# Altium footprint library COMATEL THD.PcbLib: 70 footprints (part 3 of 5)
Each footprint in its own frame and in the unit in brackets; x right, y up, seen from the top. Pads: shape width x height; smd on the part's side, far side on the other; paste and mask are expansions set on the pad; w line width, h text height; cw(c..) or ccw(c..) is an arc to the next point about the centre after c.
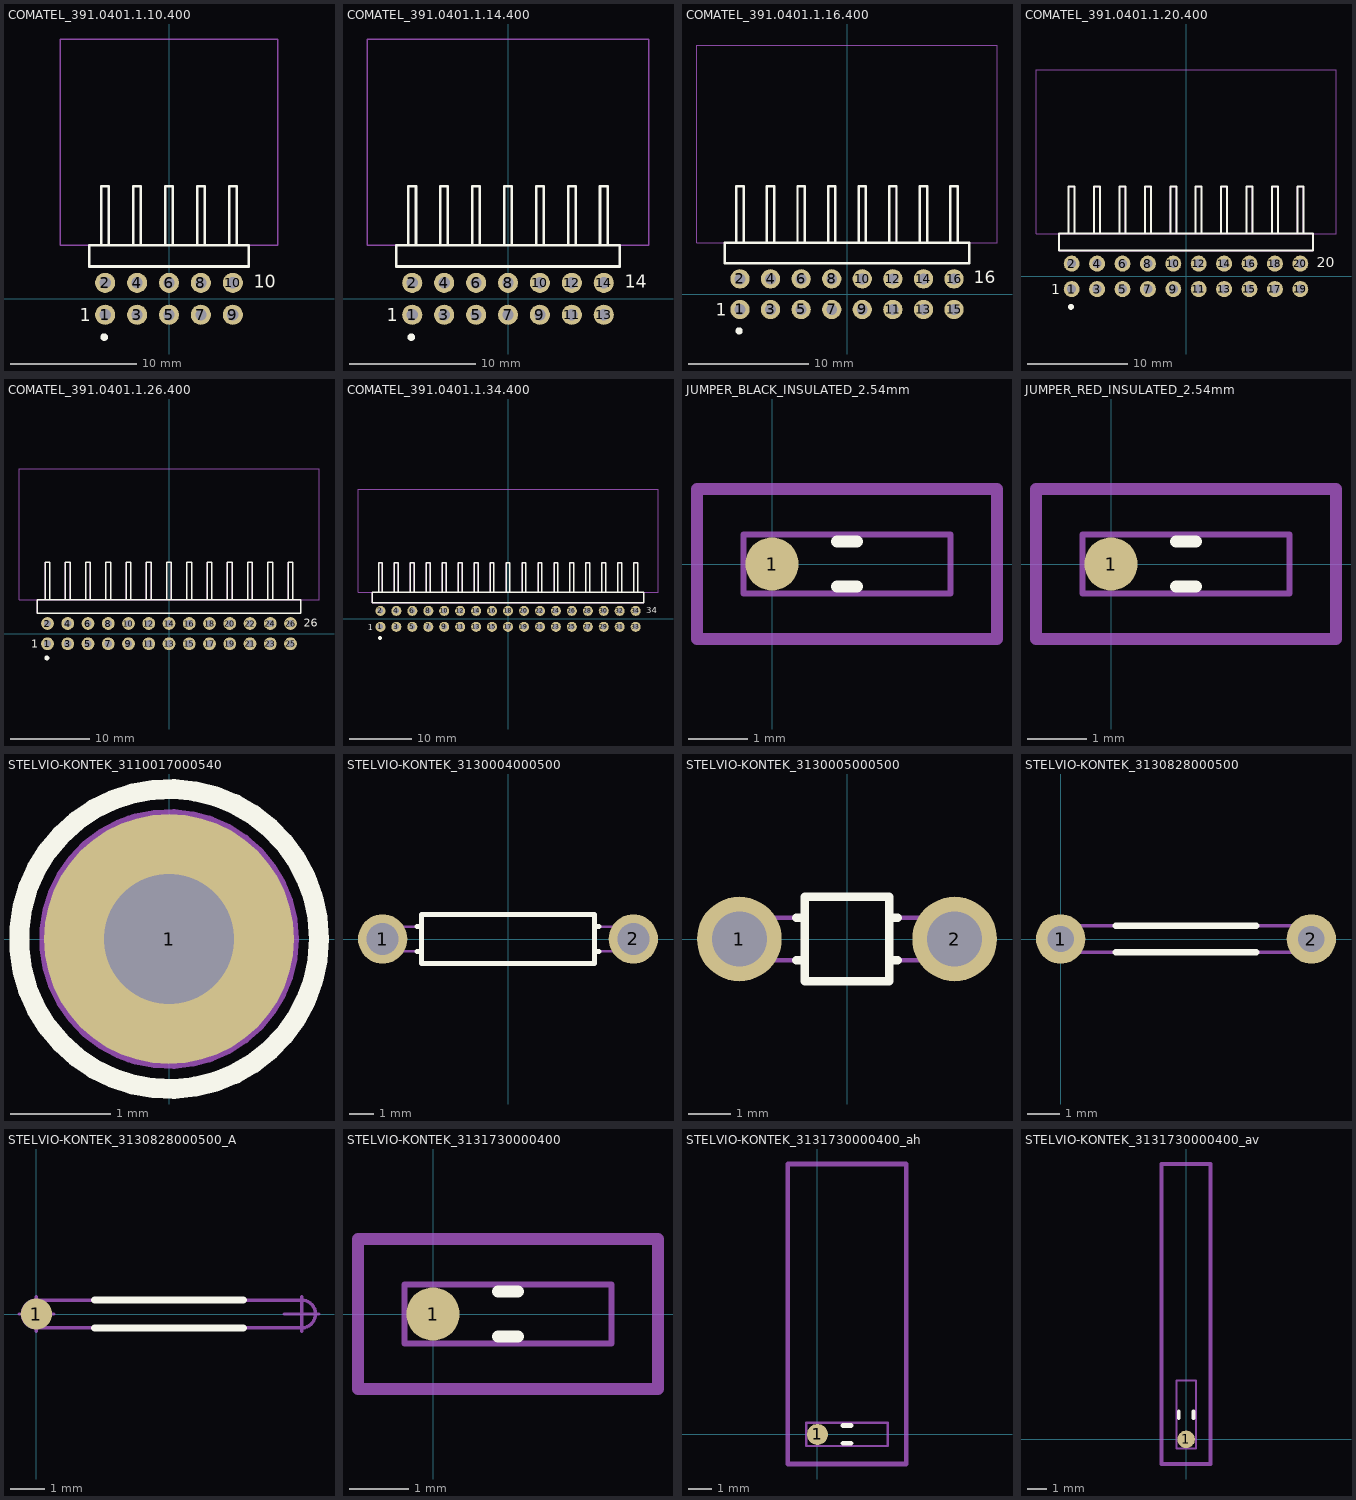
[diagram p2: the footprints below, top view; thin cyan lines are the x and y axes]

## COMATEL_391.0401.1.10.400 [mm] "10 Contacts - Pitch 2.54mm - Dual Row Right Angle Strip Header - Insulator 1.7mm"
height 8
pads (10):
  round 1.6 hole 0.9: 1(-5.08,-1.27) 2(-5.08,1.27) 3(-2.54,-1.27) 4(-2.54,1.27) 5(0,-1.27) 6(0,1.27) 7(2.54,-1.27) 8(2.54,1.27) 9(5.08,-1.27) 10(5.08,1.27)
Top Overlay:
  circle w0.3: c-5.153,-3.048 r0.15
  lines w0.2: -6.35,2.57 6.35,2.57 6.35,4.27 -6.35,4.27 -6.35,2.57 ; -5.38,4.27 -5.38,8.97 -4.78,8.97 -4.78,4.27 -5.38,4.27 ; -2.84,4.27 -2.24,4.27 -2.24,8.97 -2.84,8.97 -2.84,4.27 ; -0.3,4.27 0.3,4.27 0.3,8.97 -0.3,8.97 -0.3,4.27 ; 2.24,4.27 2.84,4.27 2.84,8.97 2.24,8.97 2.24,4.27 ; 4.78,4.27 5.38,4.27 5.38,8.97 4.78,8.97 4.78,4.27
  text "1" at -7.112,-1.778 h1.02
  text "10" at 6.731,0.889 h1.02
Mechanical 8:
  lines w0.1: -8.65,4.27 -8.65,20.67 8.65,20.67 8.65,4.27 -8.65,4.27
Mechanical 14:
  lines w0.1: -6.35,2.57 -6.35,4.27 6.35,4.27 6.35,2.57 -6.35,2.57 ; -5.38,4.27 -5.38,8.97 -4.78,8.97 -4.78,4.27 -5.38,4.27 ; -2.84,4.27 -2.24,4.27 -2.24,8.97 -2.84,8.97 -2.84,4.27 ; -0.3,4.27 0.3,4.27 0.3,8.97 -0.3,8.97 -0.3,4.27 ; 2.24,4.27 2.84,4.27 2.84,8.97 2.24,8.97 2.24,4.27 ; 4.78,4.27 5.38,4.27 5.38,8.97 4.78,8.97 4.78,4.27
  text "1" at -7.112,-1.778 h1.02
  text "10" at 6.731,0.889 h1.02
3D body "COMATEL_391.0401.1.10.400.stp": height 5.57, standoff -4.3, extent -6.35,-1.57 6.35,10.27

## COMATEL_391.0401.1.14.400 [mm] "14 Contacts - Pitch 2.54mm - Dual Row Right Angle Strip Header - Insulator 1.7mm"
height 8
pads (14):
  round 1.6 hole 0.9: 1(-7.62,-1.27) 2(-7.62,1.27) 3(-5.08,-1.27) 4(-5.08,1.27) 5(-2.54,-1.27) 6(-2.54,1.27) 7(0,-1.27) 8(0,1.27) 9(2.54,-1.27) 10(2.54,1.27) 11(5.08,-1.27) 12(5.08,1.27) 13(7.62,-1.27) 14(7.62,1.27)
Top Overlay:
  circle w0.3: c-7.693,-3.048 r0.15
  lines w0.2: -7.92,4.27 -7.32,4.27 ; -7.92,4.27 -7.92,8.97 -7.32,8.97 -7.32,4.27 ; -7.92,4.27 -7.32,4.27 ; -5.38,4.27 -4.78,4.27 ; -5.38,4.27 -5.38,8.97 -4.78,8.97 -4.78,4.27 ; -5.38,4.27 -4.78,4.27 ; -2.84,4.27 -2.24,4.27 ; -2.84,4.27 -2.84,8.97 -2.24,8.97 -2.24,4.27 ; -2.84,4.27 -2.24,4.27 ; -0.3,4.27 0.3,4.27 ; -0.3,4.27 -0.3,8.97 0.3,8.97 0.3,4.27 ; -0.3,4.27 0.3,4.27 ; 2.24,4.27 2.84,4.27 ; 2.24,4.27 2.24,8.97 2.84,8.97 2.84,4.27 ; 2.24,4.27 2.84,4.27 ; -8.89,2.57 8.89,2.57 8.89,4.27 -8.89,4.27 -8.89,2.57 ; 4.78,4.27 4.78,8.97 5.38,8.97 5.38,4.27 4.78,4.27 ; 7.32,4.27 7.32,8.97 7.92,8.97 7.92,4.27 7.32,4.27
  text "1" at -9.652,-1.778 h1.02
  text "14" at 9.271,0.889 h1.02
Mechanical 8:
  lines w0.1: -11.19,4.27 -11.19,20.67 11.19,20.67 11.19,4.27 -11.19,4.27
Mechanical 14:
  lines w0.1: -7.92,4.27 -7.32,4.27 ; -7.92,4.27 -7.92,8.97 -7.32,8.97 -7.32,4.27 ; -7.92,4.27 -7.32,4.27 ; -5.38,4.27 -4.78,4.27 ; -5.38,4.27 -5.38,8.97 -4.78,8.97 -4.78,4.27 ; -5.38,4.27 -4.78,4.27 ; -2.84,4.27 -2.24,4.27 ; -2.84,4.27 -2.84,8.97 -2.24,8.97 -2.24,4.27 ; -2.84,4.27 -2.24,4.27 ; -0.3,4.27 0.3,4.27 ; -0.3,4.27 -0.3,8.97 0.3,8.97 0.3,4.27 ; -0.3,4.27 0.3,4.27 ; 2.24,4.27 2.84,4.27 ; 2.24,4.27 2.24,8.97 2.84,8.97 2.84,4.27 ; 2.24,4.27 2.84,4.27 ; -8.89,2.57 -8.89,4.27 8.89,4.27 8.89,2.57 -8.89,2.57 ; 4.78,4.27 4.78,8.97 5.38,8.97 5.38,4.27 4.78,4.27 ; 7.32,4.27 7.32,8.97 7.92,8.97 7.92,4.27 7.32,4.27
  text "1" at -9.652,-1.778 h1.02
  text "14" at 9.271,0.889 h1.02
3D body "COMATEL_391.0401.1.14.400.stp": height 5.57, standoff -4.3, extent -8.89,-1.57 8.89,10.27

## COMATEL_391.0401.1.16.400 [mm] "16 Contacts - Pitch 2.54mm - Dual Row Right Angle Strip Header - Insulator 1.7mm"
height 8
pads (16):
  round 1.6 hole 0.9: 1(-8.89,-1.27) 2(-8.89,1.27) 3(-6.35,-1.27) 4(-6.35,1.27) 5(-3.81,-1.27) 6(-3.81,1.27) 7(-1.27,-1.27) 8(-1.27,1.27) 9(1.27,-1.27) 10(1.27,1.27) 11(3.81,-1.27) 12(3.81,1.27) 13(6.35,-1.27) 14(6.35,1.27) 15(8.89,-1.27) 16(8.89,1.27)
Top Overlay:
  circle w0.3: c-8.963,-3.048 r0.15
  lines w0.2: -9.19,4.27 -8.59,4.27 ; -9.19,4.27 -9.19,8.97 -8.59,8.97 -8.59,4.27 ; -9.19,4.27 -8.59,4.27 ; -6.65,4.27 -6.05,4.27 ; -6.65,4.27 -6.65,8.97 -6.05,8.97 -6.05,4.27 ; -6.65,4.27 -6.05,4.27 ; -4.11,4.27 -3.51,4.27 ; -4.11,4.27 -4.11,8.97 -3.51,8.97 -3.51,4.27 ; -4.11,4.27 -3.51,4.27 ; -1.57,4.27 -0.97,4.27 ; -1.57,4.27 -1.57,8.97 -0.97,8.97 -0.97,4.27 ; -1.57,4.27 -0.97,4.27 ; 0.97,4.27 1.57,4.27 ; 0.97,4.27 0.97,8.97 1.57,8.97 1.57,4.27 ; 0.97,4.27 1.57,4.27 ; -10.16,2.57 -10.16,4.27 10.16,4.27 10.16,2.57 -10.16,2.57 ; 3.51,4.27 4.11,4.27 4.11,8.97 3.51,8.97 3.51,4.27 ; 6.05,4.27 6.65,4.27 6.65,8.97 6.05,8.97 6.05,4.27 ; 8.59,4.27 8.59,8.97 9.19,8.97 9.19,4.27 8.59,4.27
  text "16" at 10.541,0.889 h1.02
  text "1" at -10.922,-1.778 h1.02
Mechanical 8:
  lines w0.1: -12.46,4.27 -12.46,20.67 12.46,20.67 12.46,4.27 -12.46,4.27
Mechanical 14:
  lines w0.1: -9.19,4.27 -8.59,4.27 ; -9.19,4.27 -9.19,8.97 -8.59,8.97 -8.59,4.27 ; -9.19,4.27 -8.59,4.27 ; -6.65,4.27 -6.05,4.27 ; -6.65,4.27 -6.65,8.97 -6.05,8.97 -6.05,4.27 ; -6.65,4.27 -6.05,4.27 ; -4.11,4.27 -3.51,4.27 ; -4.11,4.27 -4.11,8.97 -3.51,8.97 -3.51,4.27 ; -4.11,4.27 -3.51,4.27 ; -1.57,4.27 -0.97,4.27 ; -1.57,4.27 -1.57,8.97 -0.97,8.97 -0.97,4.27 ; -1.57,4.27 -0.97,4.27 ; 0.97,4.27 1.57,4.27 ; 0.97,4.27 0.97,8.97 1.57,8.97 1.57,4.27 ; 0.97,4.27 1.57,4.27 ; -10.16,2.57 10.16,2.57 10.16,4.27 -10.16,4.27 -10.16,2.57 ; 3.51,4.27 4.11,4.27 4.11,8.97 3.51,8.97 3.51,4.27 ; 6.05,4.27 6.65,4.27 6.65,8.97 6.05,8.97 6.05,4.27 ; 8.59,4.27 8.59,8.97 9.19,8.97 9.19,4.27 8.59,4.27
  text "16" at 10.541,0.889 h1.02
  text "1" at -10.922,-1.778 h1.02
3D body "COMATEL_391.0401.1.16.400.stp": height 5.57, standoff -4.3, extent -10.16,-1.57 10.16,10.27

## COMATEL_391.0401.1.20.400 [mm] "20 Contacts - Pitch 2.54mm - Dual Row Right Angle Strip Header - Insulator 1.7mm"
height 8
pads (20):
  round 1.6 hole 0.9: 1(-11.43,-1.27) 2(-11.43,1.27) 3(-8.89,-1.27) 4(-8.89,1.27) 5(-6.35,-1.27) 6(-6.35,1.27) 7(-3.81,-1.27) 8(-3.81,1.27) 9(-1.27,-1.27) 10(-1.27,1.27) 11(1.27,-1.27) 12(1.27,1.27) 13(3.81,-1.27) 14(3.81,1.27) 15(6.35,-1.27) 16(6.35,1.27) 17(8.89,-1.27) 18(8.89,1.27) 19(11.43,-1.27) 20(11.43,1.27)
Top Overlay:
  circle w0.3: c-11.503,-3.048 r0.15
  lines w0.2: -11.73,4.27 -11.13,4.27 ; -11.73,4.27 -11.73,8.97 -11.13,8.97 -11.13,4.27 ; -11.73,4.27 -11.13,4.27 ; -9.19,4.27 -8.59,4.27 ; -9.19,4.27 -9.19,8.97 -8.59,8.97 -8.59,4.27 ; -9.19,4.27 -8.59,4.27 ; -6.65,4.27 -6.05,4.27 ; -6.65,4.27 -6.65,8.97 -6.05,8.97 -6.05,4.27 ; -6.65,4.27 -6.05,4.27 ; -4.11,4.27 -3.51,4.27 ; -4.11,4.27 -4.11,8.97 -3.51,8.97 -3.51,4.27 ; -4.11,4.27 -3.51,4.27 ; -1.57,4.27 -0.97,4.27 ; -1.57,4.27 -1.57,8.97 -0.97,8.97 -0.97,4.27 ; -1.57,4.27 -0.97,4.27 ; 0.97,4.27 1.57,4.27 ; 0.97,4.27 0.97,8.97 1.57,8.97 1.57,4.27 ; 0.97,4.27 1.57,4.27 ; 3.51,4.27 4.11,4.27 ; 3.51,4.27 3.51,8.97 4.11,8.97 4.11,4.27 ; 3.51,4.27 4.11,4.27 ; 6.05,4.27 6.65,4.27 ; 6.05,4.27 6.05,8.97 6.65,8.97 6.65,4.27 ; 6.05,4.27 6.65,4.27 ; 8.59,4.27 9.19,4.27 ; 8.59,4.27 8.59,8.97 9.19,8.97 9.19,4.27 ; 8.59,4.27 9.19,4.27 ; 11.13,4.27 11.73,4.27 ; 11.13,4.27 11.13,8.97 11.73,8.97 11.73,4.27 ; 11.13,4.27 11.73,4.27 ; -12.7,2.57 -12.7,4.27 12.7,4.27 12.7,2.57 -12.7,2.57
  text "1" at -13.462,-1.778 h1.02
  text "20" at 13.081,0.889 h1.02
Mechanical 8:
  lines w0.1: -15,4.27 -15,20.67 15,20.67 15,4.27 -15,4.27
Mechanical 14:
  lines w0.1: -11.73,4.27 -11.13,4.27 ; -11.73,4.27 -11.73,8.97 -11.13,8.97 -11.13,4.27 ; -11.73,4.27 -11.13,4.27 ; -9.19,4.27 -8.59,4.27 ; -9.19,4.27 -9.19,8.97 -8.59,8.97 -8.59,4.27 ; -9.19,4.27 -8.59,4.27 ; -6.65,4.27 -6.05,4.27 ; -6.65,4.27 -6.65,8.97 -6.05,8.97 -6.05,4.27 ; -6.65,4.27 -6.05,4.27 ; -4.11,4.27 -3.51,4.27 ; -4.11,4.27 -4.11,8.97 -3.51,8.97 -3.51,4.27 ; -4.11,4.27 -3.51,4.27 ; -1.57,4.27 -0.97,4.27 ; -1.57,4.27 -1.57,8.97 -0.97,8.97 -0.97,4.27 ; -1.57,4.27 -0.97,4.27 ; 0.97,4.27 1.57,4.27 ; 0.97,4.27 0.97,8.97 1.57,8.97 1.57,4.27 ; 0.97,4.27 1.57,4.27 ; 3.51,4.27 4.11,4.27 ; 3.51,4.27 3.51,8.97 4.11,8.97 4.11,4.27 ; 3.51,4.27 4.11,4.27 ; 6.05,4.27 6.65,4.27 ; 6.05,4.27 6.05,8.97 6.65,8.97 6.65,4.27 ; 6.05,4.27 6.65,4.27 ; 8.59,4.27 9.19,4.27 ; 8.59,4.27 8.59,8.97 9.19,8.97 9.19,4.27 ; 8.59,4.27 9.19,4.27 ; 11.13,4.27 11.73,4.27 ; 11.13,4.27 11.13,8.97 11.73,8.97 11.73,4.27 ; 11.13,4.27 11.73,4.27 ; -12.7,2.57 12.7,2.57 12.7,4.27 -12.7,4.27 -12.7,2.57
  text "1" at -13.462,-1.778 h1.02
  text "20" at 13.081,0.889 h1.02
3D body "COMATEL_391.0401.1.20.400.stp": height 5.57, standoff -4.3, extent -12.7,-1.57 12.7,10.27

## COMATEL_391.0401.1.26.400 [mm] "26 Contacts - Pitch 2.54mm - Dual Row Right Angle Strip Header - Insulator 1.7mm"
height 8
pads (26):
  round 1.6 hole 0.9: 1(-15.24,-1.27) 2(-15.24,1.27) 3(-12.7,-1.27) 4(-12.7,1.27) 5(-10.16,-1.27) 6(-10.16,1.27) 7(-7.62,-1.27) 8(-7.62,1.27) 9(-5.08,-1.27) 10(-5.08,1.27) 11(-2.54,-1.27) 12(-2.54,1.27) 13(0,-1.27) 14(0,1.27) 15(2.54,-1.27) 16(2.54,1.27) 17(5.08,-1.27) 18(5.08,1.27) 19(7.62,-1.27) 20(7.62,1.27) 21(10.16,-1.27) 22(10.16,1.27) 23(12.7,-1.27) 24(12.7,1.27) 25(15.24,-1.27) 26(15.24,1.27)
Top Overlay:
  circle w0.3: c-15.313,-3.048 r0.15
  lines w0.2: -15.54,4.27 -14.94,4.27 ; -15.54,4.27 -15.54,8.97 -14.94,8.97 -14.94,4.27 ; -15.54,4.27 -14.94,4.27 ; -13,4.27 -12.4,4.27 ; -13,4.27 -13,8.97 -12.4,8.97 -12.4,4.27 ; -13,4.27 -12.4,4.27 ; -10.46,4.27 -9.86,4.27 ; -10.46,4.27 -10.46,8.97 -9.86,8.97 -9.86,4.27 ; -10.46,4.27 -9.86,4.27 ; -7.92,4.27 -7.32,4.27 ; -7.92,4.27 -7.92,8.97 -7.32,8.97 -7.32,4.27 ; -7.92,4.27 -7.32,4.27 ; -5.38,4.27 -4.78,4.27 ; -5.38,4.27 -5.38,8.97 -4.78,8.97 -4.78,4.27 ; -5.38,4.27 -4.78,4.27 ; -2.84,4.27 -2.24,4.27 ; -2.84,4.27 -2.84,8.97 -2.24,8.97 -2.24,4.27 ; -2.84,4.27 -2.24,4.27 ; -0.3,4.27 0.3,4.27 ; -0.3,4.27 -0.3,8.97 0.3,8.97 0.3,4.27 ; -0.3,4.27 0.3,4.27 ; 2.24,4.27 2.84,4.27 ; 2.24,4.27 2.24,8.97 2.84,8.97 2.84,4.27 ; 2.24,4.27 2.84,4.27 ; 4.78,4.27 5.38,4.27 ; 4.78,4.27 4.78,8.97 5.38,8.97 5.38,4.27 ; 4.78,4.27 5.38,4.27 ; 7.32,4.27 7.92,4.27 ; 7.32,4.27 7.32,8.97 7.92,8.97 7.92,4.27 ; 7.32,4.27 7.92,4.27 ; 9.86,4.27 10.46,4.27 ; 9.86,4.27 9.86,8.97 10.46,8.97 10.46,4.27 ; 9.86,4.27 10.46,4.27 ; 12.4,4.27 13,4.27 ; 12.4,4.27 12.4,8.97 13,8.97 13,4.27 ; 12.4,4.27 13,4.27 ; 14.94,4.27 15.54,4.27 ; 14.94,4.27 14.94,8.97 15.54,8.97 15.54,4.27 ; 14.94,4.27 15.54,4.27 ; -16.51,2.57 -16.51,4.27 16.51,4.27 16.51,2.57 -16.51,2.57
  text "1" at -17.272,-1.778 h1.02
  text "26" at 16.891,0.889 h1.02
Mechanical 8:
  lines w0.1: -18.81,4.27 -18.81,20.67 18.81,20.67 18.81,4.27 -18.81,4.27
Mechanical 14:
  lines w0.1: -15.54,4.27 -14.94,4.27 ; -15.54,4.27 -15.54,8.97 -14.94,8.97 -14.94,4.27 ; -15.54,4.27 -14.94,4.27 ; -13,4.27 -12.4,4.27 ; -13,4.27 -13,8.97 -12.4,8.97 -12.4,4.27 ; -13,4.27 -12.4,4.27 ; -10.46,4.27 -9.86,4.27 ; -10.46,4.27 -10.46,8.97 -9.86,8.97 -9.86,4.27 ; -10.46,4.27 -9.86,4.27 ; -7.92,4.27 -7.32,4.27 ; -7.92,4.27 -7.92,8.97 -7.32,8.97 -7.32,4.27 ; -7.92,4.27 -7.32,4.27 ; -5.38,4.27 -4.78,4.27 ; -5.38,4.27 -5.38,8.97 -4.78,8.97 -4.78,4.27 ; -5.38,4.27 -4.78,4.27 ; -2.84,4.27 -2.24,4.27 ; -2.84,4.27 -2.84,8.97 -2.24,8.97 -2.24,4.27 ; -2.84,4.27 -2.24,4.27 ; -0.3,4.27 0.3,4.27 ; -0.3,4.27 -0.3,8.97 0.3,8.97 0.3,4.27 ; -0.3,4.27 0.3,4.27 ; 2.24,4.27 2.84,4.27 ; 2.24,4.27 2.24,8.97 2.84,8.97 2.84,4.27 ; 2.24,4.27 2.84,4.27 ; 4.78,4.27 5.38,4.27 ; 4.78,4.27 4.78,8.97 5.38,8.97 5.38,4.27 ; 4.78,4.27 5.38,4.27 ; 7.32,4.27 7.92,4.27 ; 7.32,4.27 7.32,8.97 7.92,8.97 7.92,4.27 ; 7.32,4.27 7.92,4.27 ; 9.86,4.27 10.46,4.27 ; 9.86,4.27 9.86,8.97 10.46,8.97 10.46,4.27 ; 9.86,4.27 10.46,4.27 ; 12.4,4.27 13,4.27 ; 12.4,4.27 12.4,8.97 13,8.97 13,4.27 ; 12.4,4.27 13,4.27 ; 14.94,4.27 15.54,4.27 ; 14.94,4.27 14.94,8.97 15.54,8.97 15.54,4.27 ; 14.94,4.27 15.54,4.27 ; -16.51,2.57 16.51,2.57 16.51,4.27 -16.51,4.27 -16.51,2.57
  text "1" at -17.272,-1.778 h1.02
  text "26" at 16.891,0.889 h1.02
3D body "COMATEL_391.0401.1.26.400.stp": height 5.57, standoff -4.3, extent -16.51,-1.57 16.51,10.27

## COMATEL_391.0401.1.34.400 [mm] "34 Contacts - Pitch 2.54mm - Dual Row Right Angle Strip Header - Insulator 1.7mm"
height 8
pads (34):
  round 1.6 hole 0.9: 1(-20.32,-1.27) 2(-20.32,1.27) 3(-17.78,-1.27) 4(-17.78,1.27) 5(-15.24,-1.27) 6(-15.24,1.27) 7(-12.7,-1.27) 8(-12.7,1.27) 9(-10.16,-1.27) 10(-10.16,1.27) 11(-7.62,-1.27) 12(-7.62,1.27) 13(-5.08,-1.27) 14(-5.08,1.27) 15(-2.54,-1.27) 16(-2.54,1.27) 17(0,-1.27) 18(0,1.27) 19(2.54,-1.27) 20(2.54,1.27) 21(5.08,-1.27) 22(5.08,1.27) 23(7.62,-1.27) 24(7.62,1.27) 25(10.16,-1.27) 26(10.16,1.27) 27(12.7,-1.27) 28(12.7,1.27) 29(15.24,-1.27) 30(15.24,1.27) 31(17.78,-1.27) 32(17.78,1.27) 33(20.32,-1.27) 34(20.32,1.27)
Top Overlay:
  circle w0.3: c-20.393,-3.048 r0.15
  lines w0.2: -20.62,4.27 -20.02,4.27 ; -20.62,4.27 -20.02,4.27 ; -20.62,4.27 -20.02,4.27 ; -20.62,4.27 -20.62,8.97 -20.02,8.97 -20.02,4.27 ; -20.62,4.27 -20.02,4.27 ; -18.08,4.27 -17.48,4.27 ; -18.08,4.27 -17.48,4.27 ; -18.08,4.27 -17.48,4.27 ; -18.08,4.27 -18.08,8.97 -17.48,8.97 -17.48,4.27 ; -18.08,4.27 -17.48,4.27 ; -15.54,4.27 -14.94,4.27 ; -15.54,4.27 -14.94,4.27 ; -15.54,4.27 -14.94,4.27 ; -15.54,4.27 -15.54,8.97 -14.94,8.97 -14.94,4.27 ; -15.54,4.27 -14.94,4.27 ; -13,4.27 -12.4,4.27 ; -13,4.27 -12.4,4.27 ; -13,4.27 -12.4,4.27 ; -13,4.27 -13,8.97 -12.4,8.97 -12.4,4.27 ; -13,4.27 -12.4,4.27 ; -10.46,4.27 -9.86,4.27 ; -10.46,4.27 -9.86,4.27 ; -10.46,4.27 -9.86,4.27 ; -10.46,4.27 -10.46,8.97 -9.86,8.97 -9.86,4.27 ; -10.46,4.27 -9.86,4.27 ; -7.92,4.27 -7.32,4.27 ; -7.92,4.27 -7.32,4.27 ; -7.92,4.27 -7.32,4.27 ; -7.92,4.27 -7.92,8.97 -7.32,8.97 -7.32,4.27 ; -7.92,4.27 -7.32,4.27 ; -5.38,4.27 -4.78,4.27 ; -5.38,4.27 -4.78,4.27 ; -5.38,4.27 -4.78,4.27 ; -5.38,4.27 -5.38,8.97 -4.78,8.97 -4.78,4.27 ; -5.38,4.27 -4.78,4.27 ; -2.84,4.27 -2.24,4.27 ; -2.84,4.27 -2.24,4.27 ; -2.84,4.27 -2.24,4.27 ; -2.84,4.27 -2.84,8.97 -2.24,8.97 -2.24,4.27 ; -2.84,4.27 -2.24,4.27 ; -0.3,4.27 0.3,4.27 ; -0.3,4.27 0.3,4.27 ; -0.3,4.27 0.3,4.27 ; -0.3,4.27 -0.3,8.97 0.3,8.97 0.3,4.27 ; -0.3,4.27 0.3,4.27 ; 2.24,4.27 2.84,4.27 ; 2.24,4.27 2.84,4.27 ; 2.24,4.27 2.84,4.27 ; 2.24,4.27 2.24,8.97 2.84,8.97 2.84,4.27 ; 2.24,4.27 2.84,4.27 ; 4.78,4.27 5.38,4.27 ; 4.78,4.27 5.38,4.27 ; 4.78,4.27 5.38,4.27 ; 4.78,4.27 4.78,8.97 5.38,8.97 5.38,4.27 ; 4.78,4.27 5.38,4.27 ; 7.32,4.27 7.92,4.27 ; 7.32,4.27 7.92,4.27 ; 7.32,4.27 7.92,4.27 ; 7.32,4.27 7.32,8.97 7.92,8.97 7.92,4.27 ; 7.32,4.27 7.92,4.27 ; 9.86,4.27 10.46,4.27 ; 9.86,4.27 10.46,4.27 ; 9.86,4.27 10.46,4.27 ; 9.86,4.27 9.86,8.97 10.46,8.97 10.46,4.27 ; 9.86,4.27 10.46,4.27 ; 12.4,4.27 13,4.27 ; 12.4,4.27 12.4,8.97 13,8.97 13,4.27 ; 12.4,4.27 13,4.27 ; 14.94,4.27 15.54,4.27 ; 14.94,4.27 14.94,8.97 15.54,8.97 15.54,4.27 ; 14.94,4.27 15.54,4.27 ; 17.48,4.27 18.08,4.27 ; 17.48,4.27 17.48,8.97 18.08,8.97 18.08,4.27 ; 17.48,4.27 18.08,4.27 ; 20.02,4.27 20.62,4.27 ; 20.02,4.27 20.02,8.97 20.62,8.97 20.62,4.27 ; 20.02,4.27 20.62,4.27 ; -21.59,2.57 21.59,2.57 21.59,4.27 -21.59,4.27 -21.59,2.57
  text "1" at -22.352,-1.778 h1.02
  text "34" at 21.971,0.889 h1.02
Mechanical 8:
  lines w0.1: -23.89,4.27 -23.89,20.67 23.88,20.67 23.88,4.27 -23.89,4.27
Mechanical 14:
  lines w0.1: -20.62,4.27 -20.02,4.27 ; -20.62,4.27 -20.02,4.27 ; -20.62,4.27 -20.02,4.27 ; -20.62,4.27 -20.62,8.97 -20.02,8.97 -20.02,4.27 ; -20.62,4.27 -20.02,4.27 ; -18.08,4.27 -17.48,4.27 ; -18.08,4.27 -17.48,4.27 ; -18.08,4.27 -17.48,4.27 ; -18.08,4.27 -18.08,8.97 -17.48,8.97 -17.48,4.27 ; -18.08,4.27 -17.48,4.27 ; -15.54,4.27 -14.94,4.27 ; -15.54,4.27 -14.94,4.27 ; -15.54,4.27 -14.94,4.27 ; -15.54,4.27 -15.54,8.97 -14.94,8.97 -14.94,4.27 ; -15.54,4.27 -14.94,4.27 ; -13,4.27 -12.4,4.27 ; -13,4.27 -12.4,4.27 ; -13,4.27 -12.4,4.27 ; -13,4.27 -13,8.97 -12.4,8.97 -12.4,4.27 ; -13,4.27 -12.4,4.27 ; -10.46,4.27 -9.86,4.27 ; -10.46,4.27 -9.86,4.27 ; -10.46,4.27 -9.86,4.27 ; -10.46,4.27 -10.46,8.97 -9.86,8.97 -9.86,4.27 ; -10.46,4.27 -9.86,4.27 ; -7.92,4.27 -7.32,4.27 ; -7.92,4.27 -7.32,4.27 ; -7.92,4.27 -7.32,4.27 ; -7.92,4.27 -7.92,8.97 -7.32,8.97 -7.32,4.27 ; -7.92,4.27 -7.32,4.27 ; -5.38,4.27 -4.78,4.27 ; -5.38,4.27 -4.78,4.27 ; -5.38,4.27 -4.78,4.27 ; -5.38,4.27 -5.38,8.97 -4.78,8.97 -4.78,4.27 ; -5.38,4.27 -4.78,4.27 ; -2.84,4.27 -2.24,4.27 ; -2.84,4.27 -2.24,4.27 ; -2.84,4.27 -2.24,4.27 ; -2.84,4.27 -2.84,8.97 -2.24,8.97 -2.24,4.27 ; -2.84,4.27 -2.24,4.27 ; -0.3,4.27 0.3,4.27 ; -0.3,4.27 0.3,4.27 ; -0.3,4.27 0.3,4.27 ; -0.3,4.27 -0.3,8.97 0.3,8.97 0.3,4.27 ; -0.3,4.27 0.3,4.27 ; 2.24,4.27 2.84,4.27 ; 2.24,4.27 2.84,4.27 ; 2.24,4.27 2.84,4.27 ; 2.24,4.27 2.24,8.97 2.84,8.97 2.84,4.27 ; 2.24,4.27 2.84,4.27 ; 4.78,4.27 5.38,4.27 ; 4.78,4.27 5.38,4.27 ; 4.78,4.27 5.38,4.27 ; 4.78,4.27 4.78,8.97 5.38,8.97 5.38,4.27 ; 4.78,4.27 5.38,4.27 ; 7.32,4.27 7.92,4.27 ; 7.32,4.27 7.92,4.27 ; 7.32,4.27 7.92,4.27 ; 7.32,4.27 7.32,8.97 7.92,8.97 7.92,4.27 ; 7.32,4.27 7.92,4.27 ; 9.86,4.27 10.46,4.27 ; 9.86,4.27 10.46,4.27 ; 9.86,4.27 10.46,4.27 ; 9.86,4.27 9.86,8.97 10.46,8.97 10.46,4.27 ; 9.86,4.27 10.46,4.27 ; 12.4,4.27 13,4.27 ; 12.4,4.27 12.4,8.97 13,8.97 13,4.27 ; 12.4,4.27 13,4.27 ; 14.94,4.27 15.54,4.27 ; 14.94,4.27 14.94,8.97 15.54,8.97 15.54,4.27 ; 14.94,4.27 15.54,4.27 ; 17.48,4.27 18.08,4.27 ; 17.48,4.27 17.48,8.97 18.08,8.97 18.08,4.27 ; 17.48,4.27 18.08,4.27 ; 20.02,4.27 20.62,4.27 ; 20.02,4.27 20.02,8.97 20.62,8.97 20.62,4.27 ; 20.02,4.27 20.62,4.27 ; -21.59,2.57 -21.59,4.27 21.59,4.27 21.59,2.57 -21.59,2.57
  text "1" at -22.352,-1.778 h1.02
  text "34" at 21.971,0.889 h1.02
3D body "COMATEL_391.0401.1.34.400.stp": height 5.57, standoff -4.3, extent -21.59,-1.57 21.59,10.27

## JUMPER_BLACK_INSULATED_2.54mm [mm] "Black Insulated Jumper Pitch 2.54mm W=2.5mm L=5mm H=6.5mm"
height 6.5
pads (1):
  round 0.9 smd paste-0.46 mask-0.46: 1(0,0)
Top Overlay:
  lines w0.2: 1.1,-0.381 1.44,-0.381 ; 1.1,0.381 1.44,0.381
Mechanical 13:
  lines w0.2: -1.27,-1.27 3.81,-1.27 3.81,1.27 -1.27,1.27 -1.27,-1.27
Mechanical 14:
  lines w0.1: -0.48,-0.5 3.02,-0.5 3.02,0.5 -0.48,0.5 -0.48,-0.5
3D body "JUMPER_BLACK_INSULATED_2.54MM.stp": height 8.2, standoff 1.7, extent -1.269,-1.269 3.731,1.231

## JUMPER_RED_INSULATED_2.54mm [mm] "Red Insulated Jumper Pitch 2.54mm W=2.5mm L=5mm H=6.5mm"
height 6.5
pads (1):
  round 0.9 smd paste-0.46 mask-0.46: 1(0,0)
Top Overlay:
  lines w0.2: 1.1,-0.381 1.44,-0.381 ; 1.1,0.381 1.44,0.381
Mechanical 13:
  lines w0.2: -1.27,-1.27 -1.27,1.27 3.81,1.27 3.81,-1.27 -1.27,-1.27
Mechanical 14:
  lines w0.1: -0.48,-0.5 -0.48,0.5 3.02,0.5 3.02,-0.5 -0.48,-0.5
3D body "JUMPER_RED_INSULATED_2.54MM.stp": height 8.2, standoff 1.7, extent -1.269,-1.269 3.731,1.231

## STELVIO-KONTEK_3110017000540 [mm] "Solder Fork Terminal ( hole 1.3 mm)"
height 4.2
pads (1):
  round 2.5 hole 1.3: 1(0,0)
Top Overlay:
  circle w0.2: c0,0 r1.5
Mechanical 8:
  lines w0.1: -1,0 0,0 ; 0,-1 0,0 ; 0,1 0,0 ; 1,0 0,0
Mechanical 14:
  circle w0.1: c0,0 r1.25
  lines w0.1: -0.4,-1.184 -0.4,-0.447 ccw(c0,0) 0.4,-0.447 0.4,-1.184 ; -0.4,1.184 -0.4,0.447 cw(c0,0) 0.4,0.447 0.4,1.184
3D body "STELVIO-KONTEK_3110017000540.stp": height 4, standoff -2.6, extent -1.25,-1.25 1.25,1.25

## STELVIO-KONTEK_3130004000500 [mm] "Male Jumper Pitch 10.16mm"
height 3
pads (2):
  round 2 hole 1.3: 1(-5.08,0) 2(5.08,0.001)
Top Overlay:
  lines w0.2: -3.7,-0.501 -3.5,-0.501 ; -3.7,0.499 -3.5,0.499 ; 3.5,-0.501 3.7,-0.501 ; 3.5,0.499 3.7,0.499 ; -3.5,-1.001 -3.5,0.999 3.5,0.999 3.5,-1.001 -3.5,-1.001
Mechanical 14:
  lines w0.1: -3.5,-0.501 -5.08,-0.501 cw(c-5.08,-0.001) -5.08,0.499 -3.5,0.499 ; 3.5,-0.501 5.08,-0.501 ccw(c5.08,-0.001) 5.08,0.499 3.5,0.499 ; -3.5,-1.001 3.5,-1.001 3.5,0.999 -3.5,0.999 -3.5,-1.001
3D body "STELVIO-KONTEK_3130004000500.stp": height 3, standoff -3.2, extent -5.58,-0.999 5.58,1.001

## STELVIO-KONTEK_3130005000500 [mm] "Male Jumper Pitch 5.08mm"
height 3
pads (2):
  round 2 hole 1.3: 1(-2.54,0) 2(2.54,0)
Top Overlay:
  lines w0.2: -1.2,-0.5 -1,-0.5 ; -1.2,0.5 -1,0.5 ; 1,-0.5 1.2,-0.5 ; 1,0.5 1.2,0.5 ; -1,-1 1,-1 1,1 -1,1 -1,-1
Mechanical 14:
  lines w0.1: -1,-0.5 -2.54,-0.5 cw(c-2.54,0) -2.54,0.5 -1,0.5 ; 1,-0.5 2.54,-0.5 ccw(c2.54,0) 2.54,0.5 1,0.5 ; -1,-1 1,-1 1,1 -1,1 -1,-1
3D body "STELVIO-KONTEK_3130005000500.stp": height 3, standoff -3.2, extent -3.04,-1 3.04,1

## STELVIO-KONTEK_3130828000500 [mm] "Pitch 7.62mm Non-Insulated Male Jumper (0.5mm pin Diameter)"
height 3.5
pads (2):
  round 1.5 hole 0.8: 1(0,0) 2(7.62,0)
Top Overlay:
  lines w0.2: 1.67,-0.4 5.95,-0.4 ; 1.67,0.4 5.95,0.4
Mechanical 8:
  lines w0.1: -0.5,0 0,0 ; 0,-0.5 0,0 ; 0,0.5 0,0 ; 0.5,0 0,0 ; 7.12,0 7.62,0 ; 7.62,-0.5 7.62,0 ; 7.62,0.5 7.62,0 ; 8.12,0 7.62,0
Mechanical 14:
  lines w0.1: 7.578,-0.398 ccw(c7.62,0) 7.62,0.4 0,0.4 ccw(c0,0) 0,-0.4 7.62,-0.4
3D body "STELVIO-KONTEK_3130828000500.stp": height 2.4, standoff -3.5, extent -0.4,-0.4 8.02,0.4

## STELVIO-KONTEK_3130828000500_A [mm] "Pitch 7.62mm Non-Insulated Male Jumper (0.5mm pin Diameter)"
height 3.5
pads (1):
  round 0.9 smd paste-0.46 mask-0.46: 1(0,0)
Top Overlay:
  lines w0.2: 1.67,-0.4 5.95,-0.4 ; 1.67,0.4 5.95,0.4
Mechanical 8:
  lines w0.1: -0.5,0 0,0 ; 0,-0.5 0,0 ; 0,0.5 0,0 ; 0.5,0 0,0 ; 7.12,0 7.62,0 ; 7.62,-0.5 7.62,0 ; 7.62,0.5 7.62,0 ; 8.12,0 7.62,0
Mechanical 14:
  lines w0.1: 7.578,-0.398 ccw(c7.62,0) 7.62,0.4 0,0.4 ccw(c0,0) 0,-0.4 7.62,-0.4
3D body "STELVIO-KONTEK_3130828000500.stp": height 2.4, standoff -3.5, extent -0.4,-0.4 8.02,0.4

## STELVIO-KONTEK_3131730000400 [mm] "Black Insulated Jumper Pitch 2.54mm W=2.5mm L=5mm H=6.5mm"
height 6.5
pads (1):
  round 0.9 smd paste-0.46 mask-0.46: 1(0,0)
Top Overlay:
  lines w0.2: 1.1,-0.381 1.44,-0.381 ; 1.1,0.381 1.44,0.381
Mechanical 13:
  lines w0.2: -1.27,-1.27 3.81,-1.27 3.81,1.27 -1.27,1.27 -1.27,-1.27
Mechanical 14:
  lines w0.1: -0.48,-0.5 3.02,-0.5 3.02,0.5 -0.48,0.5 -0.48,-0.5
3D body "STELVIO-KONTEK_3131730000400.stp": height 6.5, standoff 0, extent -1.23,-1.25 3.77,1.25

## STELVIO-KONTEK_3131730000400_ah [mm] "Black Insulated Jumper Pitch 2.54mm W=2.5mm L=5mm H=6.5mm"
height 6.5
pads (1):
  round 0.9 smd paste-0.46 mask-0.46: 1(0,0)
Top Overlay:
  lines w0.2: 1.1,-0.381 1.44,-0.381 ; 1.1,0.381 1.44,0.381
Mechanical 13:
  lines w0.2: -1.27,-1.27 -1.27,11.6 3.81,11.6 3.81,-1.27 -1.27,-1.27
Mechanical 14:
  lines w0.1: -0.48,-0.5 -0.48,0.5 3.02,0.5 3.02,-0.5 -0.48,-0.5
3D body "STELVIO-KONTEK_3131730000400_ah.stp": height 2.5, standoff 0, extent -1.234,5.08 3.766,11.58

## STELVIO-KONTEK_3131730000400_av [mm] "Black Insulated Jumper Pitch 2.54mm W=2.5mm L=5mm H=6.5mm"
height 6.5
pads (1):
  round 0.9 smd paste-0.46 mask-0.46: 1(0,0)
Top Overlay:
  lines w0.2: -0.381,1.1 -0.381,1.44 ; 0.381,1.1 0.381,1.44
Mechanical 13:
  lines w0.2: -1.27,-1.27 1.25,-1.27 1.25,14.15 -1.27,14.15 -1.27,-1.27
Mechanical 14:
  lines w0.1: -0.5,-0.48 0.5,-0.48 0.5,3.02 -0.5,3.02 -0.5,-0.48
3D body "STELVIO-KONTEK_3131730000400_av.stp": height 5, standoff 0, extent -1.25,7.62 1.25,14.12